# Altium footprint library 常用元件封装库.PcbLib: 1310 footprints (part 28 of 83)
Each footprint in its own frame and in the unit in brackets; x right, y up, seen from the top. Pads: shape width x height; smd on the part's side, far side on the other; paste and mask are expansions set on the pad; w line width, h text height; cw(c..) or ccw(c..) is an arc to the next point about the centre after c.
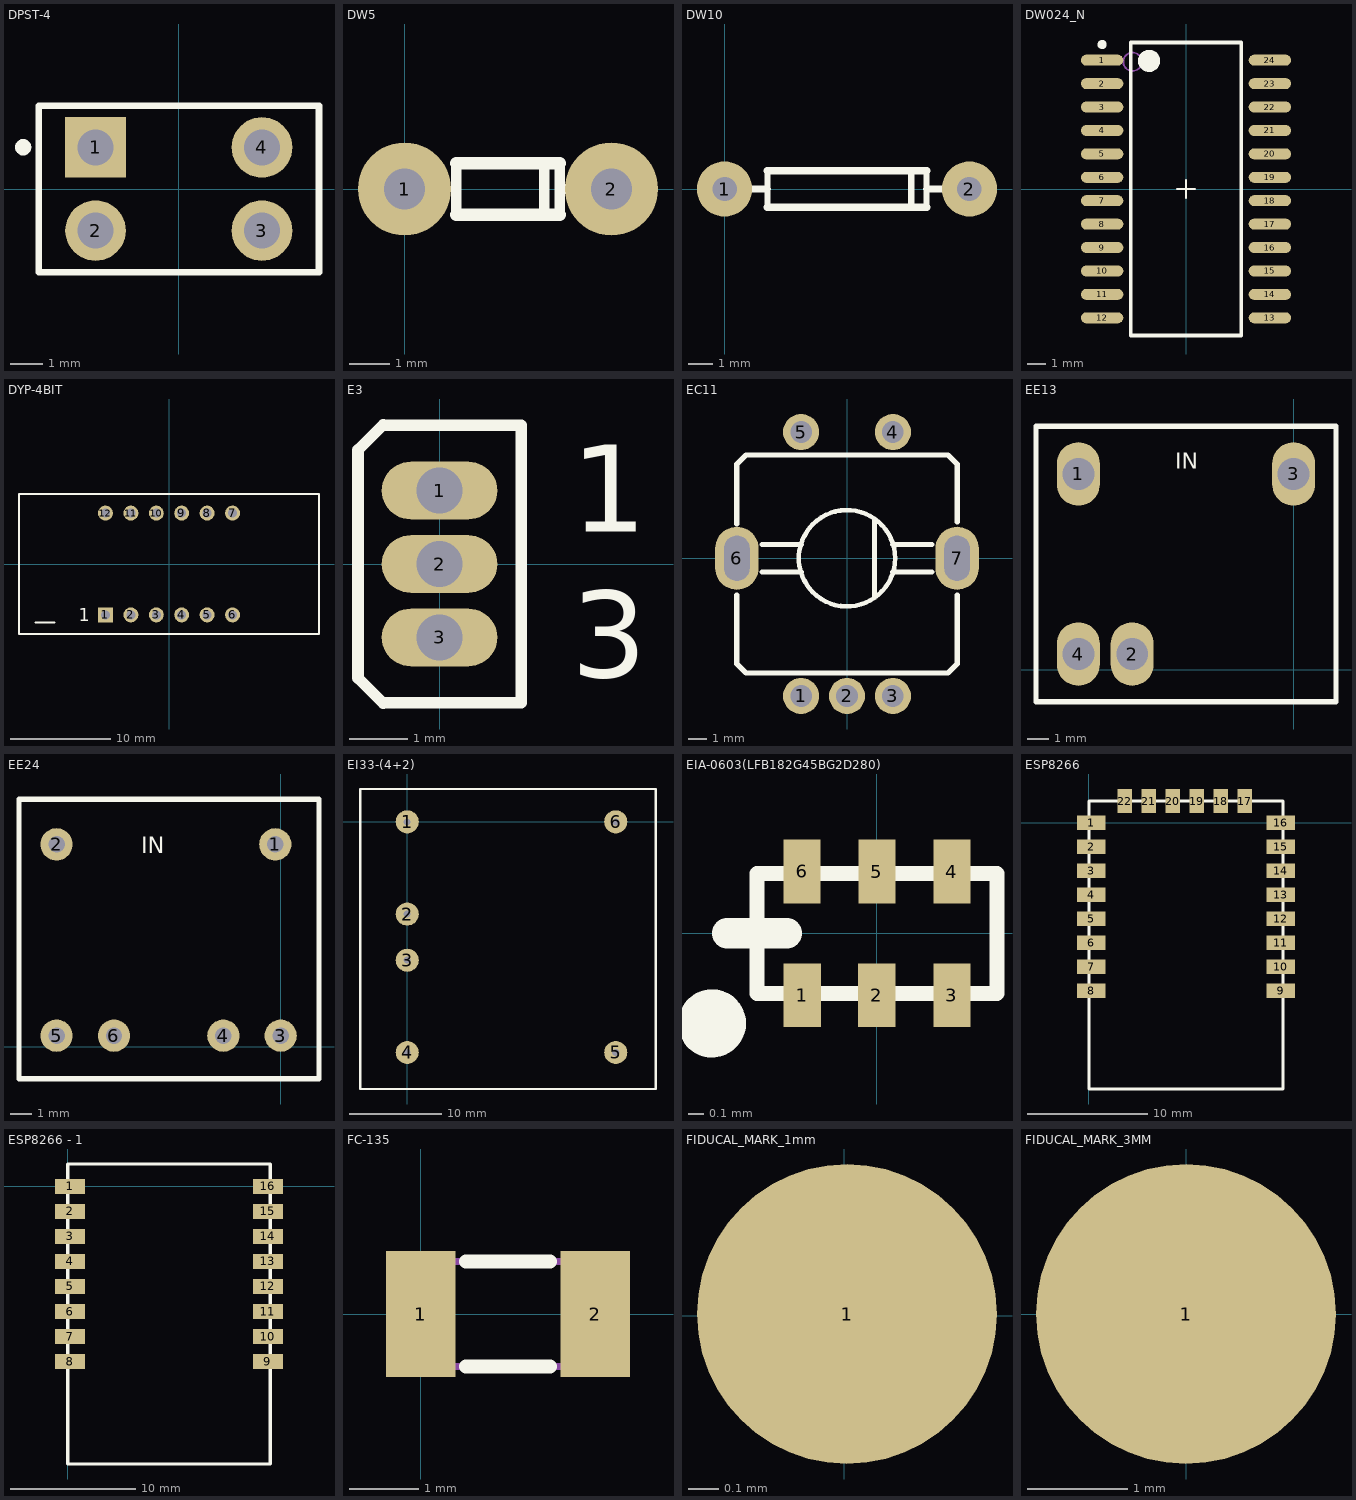
[diagram p27: the footprints below, top view; thin cyan lines are the x and y axes]

## DPST-4 [mm] "Double-Pole, Single-Throw Switch; 4 Leads"
pads (4):
  rect 1.85x1.85 hole 1.1: 1(-2.54,1.27)
  round 1.85 hole 1.1: 2(-2.54,-1.27) 3(2.54,-1.27) 4(2.54,1.27)
Top Overlay:
  circle w0.25: c-4.751,1.274 r0.125
  lines w0.2: -4.28,-2.54 4.28,-2.54 4.28,2.54 -4.28,2.54 -4.28,-2.54

## DW5 [mil]
pads (2):
  round 90 hole 40: 1(0,0) 2(200,0)
Top Overlay:
  lines w10: 0,0 40,0 ; 50,-25 50,25 ; 135,-25 135,25 ; 150,-25 150,25 ; 155,0 200,0
  lines w12: 50,-25 150,-25 ; 50,25 150,25

## DW10 [mil]
pads (2):
  round 90 hole 40: 1(0,0) 2(400,0)
Top Overlay:
  lines w10: 70,-30 70,30 ; 305,-30 305,30 ; 330,-30 330,30
  lines w12: 40,0 70,0 ; 70,-30 330,-30 ; 70,30 330,30 ; 330,0 360,0

## DW024_N [mm] "74hc154"
height 2.65
pads (24):
  oval 2.3x0.6 smd: 1(-4.55,6.985) 2(-4.55,5.715) 3(-4.55,4.445) 4(-4.55,3.175) 5(-4.55,1.905) 6(-4.55,0.635) 7(-4.55,-0.635) 8(-4.55,-1.905) 9(-4.55,-3.175) 10(-4.55,-4.445) 11(-4.55,-5.715) 12(-4.55,-6.985) 13(4.55,-6.985) 14(4.55,-5.715) 15(4.55,-4.445) 16(4.55,-3.175) 17(4.55,-1.905) 18(4.55,-0.635) 19(4.55,0.635) 20(4.55,1.905) 21(4.55,3.175) 22(4.55,4.445) 23(4.55,5.715) 24(4.55,6.985)
Top Overlay:
  circle w0.6: c-2,6.95 r0.3
  circle w0.25: c-4.55,7.835 r0.125
  lines w0.1: -0.5,0 0.5,0 ; 0,-0.5 0,0.5
  lines w0.2: -3,-7.95 3,-7.95 3,7.95 -3,7.95 -3,-7.95
Mechanical 13:
  circle w0.1: c-2.9,6.9 r0.5
3D body: height 2.65, standoff 0, extent -3.8,-7.8 3.8,7.8

## DYP-4BIT [mm] "数码管"
height 1.2
pads (12):
  rect 1.5x1.5 hole 0.9: 1(-6.35,-5.08)
  round 1.5 hole 0.9: 2(-3.81,-5.08) 3(-1.27,-5.08) 4(1.27,-5.08) 5(3.81,-5.08) 6(6.35,-5.08) 7(6.35,5.08) 8(3.81,5.08) 9(1.27,5.08) 10(-1.27,5.08) 11(-3.81,5.08) 12(-6.35,5.08)
Top Overlay:
  lines w0.2: -13.335,-5.842 -11.43,-5.842 ; -14.986,-6.985 14.986,-6.985 14.986,6.985 -14.986,6.985 -14.986,-6.985
  text "1" at -9.017,-5.715 h1.27

## E3 [mm] "TO, Flat Index; 3 In-Line, Axial Leads; Body Dia. 4.6mm; Lead Dia. 0.5 mm (max)"
height 4.01
pads (3):
  oval 2x1 hole 0.8: 1(0,1.27) 2(0,0) 3(0,-1.27)
Top Overlay:
  lines w0.2: -0.97,-2.41 -1.41,-1.97 -1.41,1.97 -0.97,2.41 ; -0.97,-2.4 1.41,-2.4 1.41,2.4 -0.97,2.4
  text "3" at 2.275,-1.963 h1.5
  text "1" at 2.275,0.555 h1.5

## EC11 [mm]
pads (7):
  round 2 hole 1.2: 1(-2.54,-7.62) 2(0,-7.62) 3(2.54,-7.62) 4(2.54,6.985) 5(-2.54,6.985)
  oval 2.4x3.5 hole 1.4 slot 2.5 at 90 deg: 6(-6.096,0) 7(6.096,0)
Top Overlay:
  circle w0.254: c0,0 r2.667
  lines w0.3: -6.096,-2.032 -6.096,-5.842 -5.588,-6.35 5.588,-6.35 6.096,-5.842 6.096,-2.032 ; -6.096,1.905 -6.096,5.207 -5.588,5.715 5.588,5.715 6.096,5.207 6.096,2.032 ; -4.699,-0.762 -2.54,-0.762 ; -4.699,0.762 -2.54,0.762 ; 1.524,-2.159 1.524,2.159 ; 2.54,-0.762 4.699,-0.762 ; 2.54,0.762 4.699,0.762

## EE13 [mm]
pads (4):
  oval 2.032x3 hole 1.5: 1(-10.16,9.25) 2(-7.62,0.75) 3(0,9.25) 4(-10.16,0.75)
Top Overlay:
  lines w0.254: -12.16,-1.5 2,-1.5 2,11.5 -12.16,11.5 -12.16,-1.5
  text "IN" at -5.588,9.492 h0.76
3D body "User Library-EE13-T304.STEP": height 11.88, standoff -4.67, extent -11.741,-1.298 1.479,11.102

## EE24 [mil]
pads (6):
  round 59.06 hole 30: 1(-10,370) 2(-410,370) 3(0,20) 4(-105,20) 5(-410,20) 6(-305,20)
Top Overlay:
  lines w10: -478.74,-59.06 70,-59.06 70,452.76 -478.74,452.76 -478.74,-59.06
  text "IN" at -255,353.7 h30
3D body "User Library-EE13-T304.STEP": height 467.9, standoff -184.01, extent -465.49,-49.1 55,439.1

## EI33-(4+2) [mm]
pads (6):
  round 2.5 hole 0.762: 1(0,0) 2(0,-10) 3(0,-15) 4(0,-25) 5(22.6,-25) 6(22.6,0)
Top Overlay:
  lines w0.254: -5.08,-28.956 -5.08,3.556 26.924,3.556 26.924,-28.956 -5.08,-28.956

## EIA-0603(LFB182G45BG2D280) [mm]
pads (6):
  rect 0.25x0.425 smd: 1(-0.5,-0.413) 2(0,-0.413) 3(0.5,-0.412) 4(0.5,0.412) 5(0,0.412) 6(-0.5,0.413)
Top Overlay:
  circle w0.254: c-1.1,-0.6 r0.1
  lines w0.102: -0.8,-0.4 -0.8,0.4 0.8,0.4 0.8,-0.4 -0.8,-0.4
  lines w0.203: -1,0 -0.6,0

## ESP8266 [mm]
pads (22):
  rect 2.4x1.2 smd: 1(0.2,0) 2(0.2,-2) 3(0.2,-4) 4(0.2,-6) 5(0.2,-8) 6(0.2,-10) 7(0.2,-12) 8(0.2,-14) 9(16,-14) 10(16,-12) 11(16,-10) 12(16,-8) 13(16,-6) 14(16,-4) 15(16,-2) 16(16,0)
  rect 1.2x2 smd: 17(13,1.8) 18(11,1.8) 19(9,1.8) 20(7,1.8) 21(5,1.8) 22(3,1.8)
Top Overlay:
  lines w0.254: 0,-22.2 0,1.8 16.2,1.8 16.2,-22.2 0,-22.2
3D body "User Library-ESP07-1.STEP": height 3.5, standoff -0.01, extent 0.063,-20.522 16.063,1.478

## ESP8266 - 1 [mm]
pads (16):
  rect 2.4x1.2 smd: 1(0.2,0) 2(0.2,-2) 3(0.2,-4) 4(0.2,-6) 5(0.2,-8) 6(0.2,-10) 7(0.2,-12) 8(0.2,-14) 9(16,-14) 10(16,-12) 11(16,-10) 12(16,-8) 13(16,-6) 14(16,-4) 15(16,-2) 16(16,0)
Top Overlay:
  lines w0.254: 0,-22.2 0,1.8 16.2,1.8 16.2,-22.2 0,-22.2
3D body "User Library-ESP07-1.STEP": height 3.5, standoff -0.01, extent 0.063,-20.522 16.063,1.478

## FC-135 [mm]
pads (2):
  rect 1x1.8 smd: 1(0,0) 2(2.5,0)
Top Overlay:
  lines w0.2: 0.65,-0.75 1.85,-0.75 ; 0.65,0.75 1.85,0.75
Mechanical 3:
  lines w0.1: -0.35,-0.55 cw(c-0.35,-0.75) -0.15,-0.75 2.65,-0.75 cw(c2.85,-0.75) 2.85,-0.55 2.85,0.55 cw(c2.85,0.75) 2.65,0.75 -0.15,0.75 cw(c-0.35,0.75) -0.35,0.55 -0.35,-0.55

## FIDUCAL_MARK_1mm [mm]
pads (1):
  round 1 smd: 1(0.008,0.007)

## FIDUCAL_MARK_3MM [mm]
pads (1):
  round 3 smd: 1(0,0)